# Altium footprint library SMotlaq-PCB_lib.PcbLib: 186 footprints (part 8 of 12)
Each footprint in its own frame and in the unit in brackets; x right, y up, seen from the top. Pads: shape width x height; smd on the part's side, far side on the other; paste and mask are expansions set on the pad; w line width, h text height; cw(c..) or ccw(c..) is an arc to the next point about the centre after c.
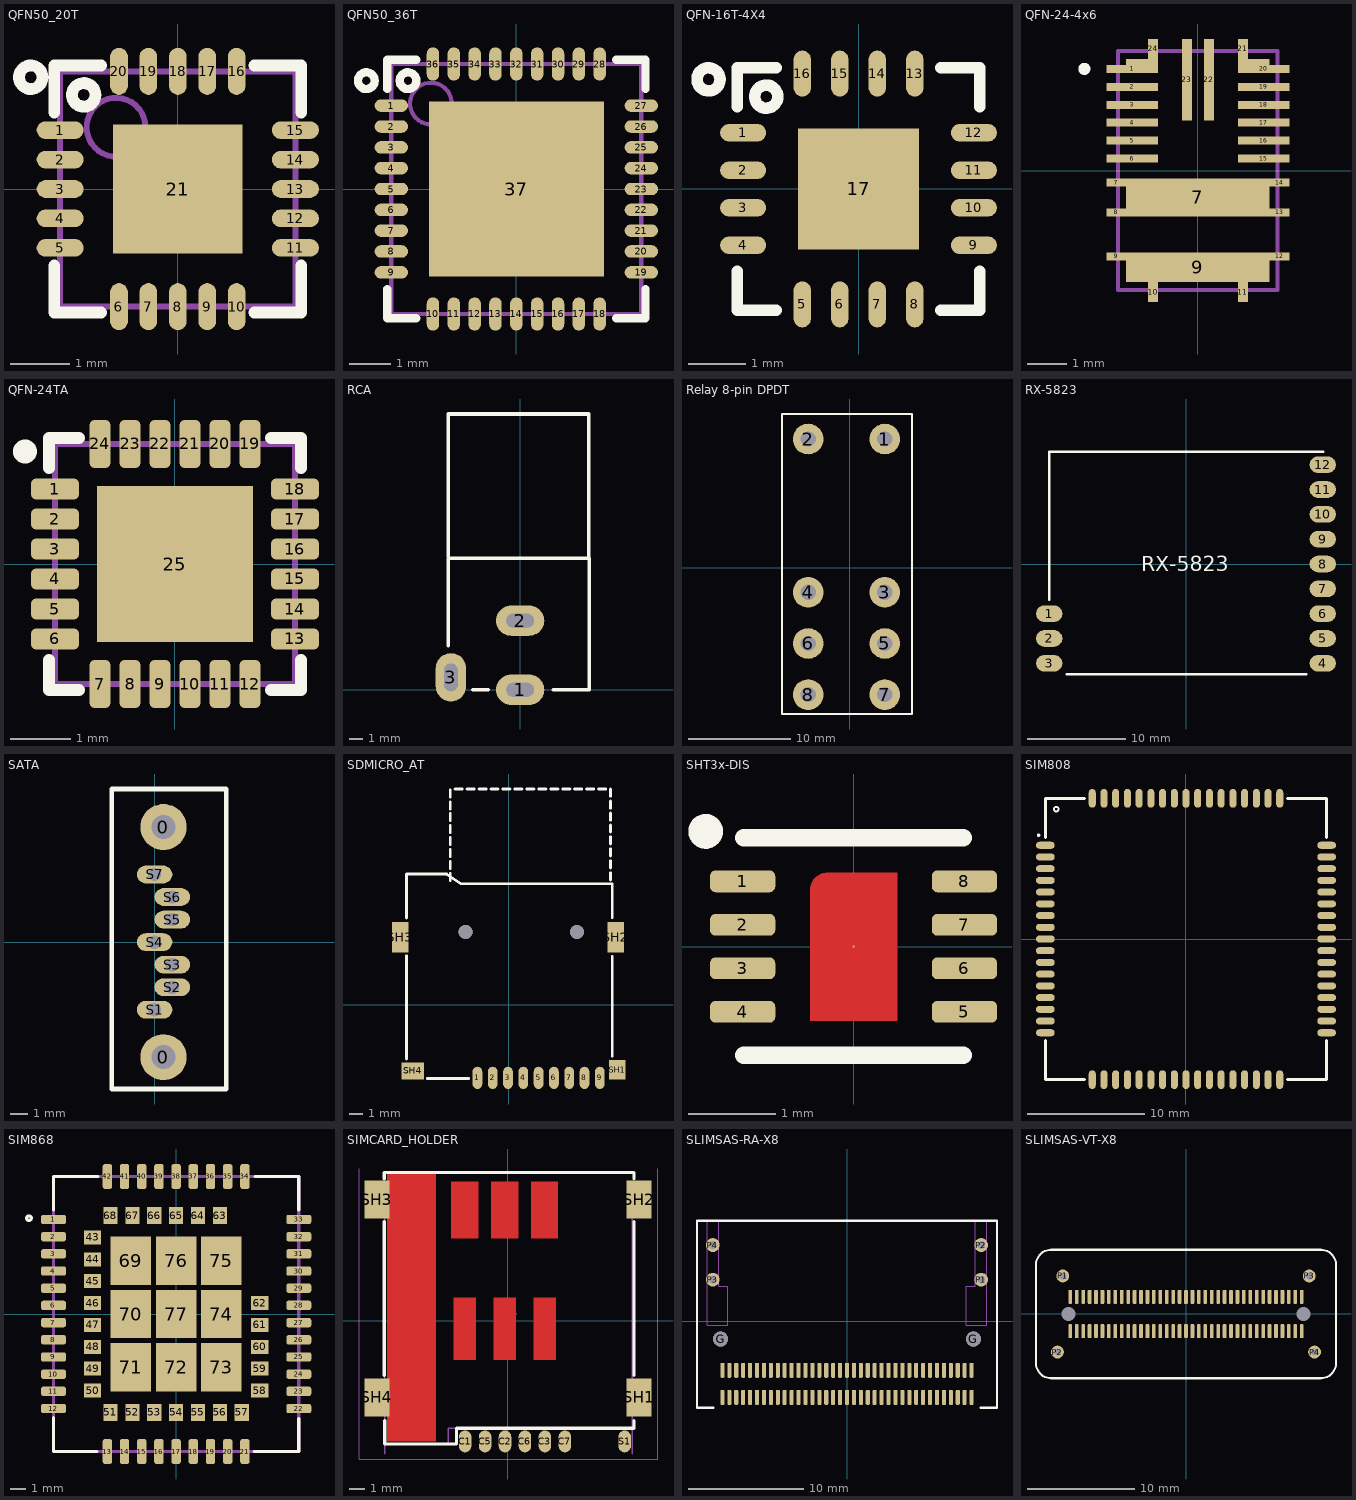
[diagram p7: the footprints below, top view; thin cyan lines are the x and y axes]

## QFN50_20T [mm] "QFN, 20, 4X4mm, 0.5mm"
height 1
pads (21):
  oval 0.8x0.3 smd mask+0.05: 1(-2,1) 2(-2,0.5) 3(-2,0) 4(-2,-0.5) 5(-2,-1) 11(2,-1) 12(2,-0.5) 13(2,0) 14(2,0.5) 15(2,1)
  oval 0.3x0.8 smd mask+0.05: 6(-1,-2) 7(-0.5,-2) 8(0,-2) 9(0.5,-2) 10(1,-2) 16(1,2) 17(0.5,2) 18(0,2) 19(-0.5,2) 20(-1,2)
  rect 2.2x2.2 smd paste-2 mask+0.1: 21(0,0)
Top Overlay:
  circle w0.2: c-2.5,1.9 r0.2
  circle w0.2: c-1.6,1.6 r0.2
  lines w0.2: -2.1,-1.3 -2.1,-2.1 -1.3,-2.1 ; -2.1,1.3 -2.1,2.1 -1.3,2.1 ; 1.3,-2.1 2.1,-2.1 2.1,-1.3 ; 1.3,2.1 2.1,2.1 2.1,1.3
Top Paste:
  rectangle: -1,0.2 -0.2,1
  region: 1,1 0.2,1 0.2,0.2 1,0.2
  region: 1,-0.2 0.2,-0.2 0.2,-1 1,-1
  rectangle: -1,-1 -0.2,-0.2
Mechanical 13:
  circle w0.1: c-1.05,1.05 r0.5
  lines w0.1: -2,-2 2,-2 2,2 -2,2 -2,-2
3D body: height 1, standoff 0, extent -2,-2 2,2

## QFN50_36T [mm] "MO-220-VJJD (JEDEC), 36 TQFN T3666+3 (MAXIM), 6X6mm, 0.5mm"
height 0.9
pads (37):
  oval 0.8x0.3 smd mask+0.05: 1(-3,2) 2(-3,1.5) 3(-3,1) 4(-3,0.5) 5(-3,0) 6(-3,-0.5) 7(-3,-1) 8(-3,-1.5) 9(-3,-2) 19(3,-2) 20(3,-1.5) 21(3,-1) 22(3,-0.5) 23(3,0) 24(3,0.5) 25(3,1) 26(3,1.5) 27(3,2)
  oval 0.3x0.8 smd mask+0.05: 10(-2,-3) 11(-1.5,-3) 12(-1,-3) 13(-0.5,-3) 14(0,-3) 15(0.5,-3) 16(1,-3) 17(1.5,-3) 18(2,-3) 28(2,3) 29(1.5,3) 30(1,3) 31(0.5,3) 32(0,3) 33(-0.5,3) 34(-1,3) 35(-1.5,3) 36(-2,3)
  rect 4.2x4.2 smd paste-3 mask+0.1: 37(0,0)
Top Overlay:
  circle w0.2: c-3.6,2.6 r0.2
  circle w0.2: c-2.6,2.6 r0.2
  lines w0.2: -3.1,-2.4 -3.1,-3.1 -2.4,-3.1 ; -3.1,2.4 -3.1,3.1 -2.4,3.1 ; 2.4,-3.1 3.1,-3.1 3.1,-2.4 ; 2.4,3.1 3.1,3.1 3.1,2.4
Top Paste:
  rectangle: -1,0.2 -0.2,1
  rectangle: -2,1.2 -1.2,2
  region: -0.2,2 -1,2 -1,1.2 -0.2,1.2
  rectangle: -2,0.2 -1.2,1
  region: 2,1 1.2,1 1.2,0.2 2,0.2
  rectangle: 0.2,1.2 1,2
  region: 2,2 1.2,2 1.2,1.2 2,1.2
  region: 1,1 0.2,1 0.2,0.2 1,0.2
  region: 1,-0.2 0.2,-0.2 0.2,-1 1,-1
  region: 2,-1.2 1.2,-1.2 1.2,-2 2,-2
  rectangle: 0.2,-2 1,-1.2
  region: 2,-0.2 1.2,-0.2 1.2,-1 2,-1
  rectangle: -2,-1 -1.2,-0.2
  region: -0.2,-1.2 -1,-1.2 -1,-2 -0.2,-2
  rectangle: -2,-2 -1.2,-1.2
  rectangle: -1,-1 -0.2,-0.2
Mechanical 13:
  circle w0.1: c-2.05,2.05 r0.5
  lines w0.1: -3,-3 -3,3 3,3 3,-3 -3,-3
3D body "ALSRobot-QFN36 6x6.step": height 0.9, standoff 0.01, extent -3.102,-3.103 3.103,3.103

## QFN-16T-4X4 [mm] "QFN, 16, 4X4mm, 0.5mm"
height 1
pads (17):
  oval 0.8x0.3 smd mask+0.075: 1(-2,0.975) 2(-2,0.325) 3(-2,-0.325) 4(-2,-0.975) 9(2,-0.975) 10(2,-0.325) 11(2,0.325) 12(2,0.975)
  oval 0.3x0.8 smd mask+0.075: 5(-0.975,-2) 6(-0.325,-2) 7(0.325,-2) 8(0.975,-2) 13(0.975,2) 14(0.325,2) 15(-0.325,2) 16(-0.975,2)
  rect 2.1x2.1 smd paste-3 mask+0.1: 17(0,0)
Top Overlay:
  circle w0.2: c-2.6,1.9 r0.2
  circle w0.2: c-1.6,1.6 r0.2
  lines w0.2: -2.1,-1.425 -2.1,-2.1 -1.425,-2.1 ; -2.1,1.425 -2.1,2.1 -1.425,2.1 ; 1.425,-2.1 2.1,-2.1 2.1,-1.425 ; 1.425,2.1 2.1,2.1 2.1,1.425
Top Paste:
  region: 1.05,1.05 0.15,1.05 0.15,0.15 1.05,0.15
  rectangle: -1.05,0.15 -0.15,1.05
  region: 1.05,-0.15 0.15,-0.15 0.15,-1.05 1.05,-1.05
  rectangle: -1.05,-1.05 -0.15,-0.15
3D body "User Library-SKY12209.step": height 1.5, standoff 0, extent -2,-2 2,2

## QFN-24-4x6 [mm]
pads (28):
  rect 1.3x0.2 smd: 1(-1.65,2.55) 2(-1.65,2.1) 3(-1.65,1.65) 4(-1.65,1.2) 5(-1.65,0.75) 6(-1.65,0.3) 15(1.65,0.3) 16(1.65,0.75) 17(1.65,1.2) 18(1.65,1.65) 19(1.65,2.1) 20(1.65,2.55)
  rect 0.8x0.15 smd: 1(-1.4,2.725) 20(1.4,2.725)
  rect 0.5x0.2 smd: 7(-2.05,-0.3) 8(-2.05,-1.05) 9(-2.05,-2.15) 12(2.05,-2.15) 13(2.05,-1.05) 14(2.05,-0.3)
  rect 3.6x0.95 smd: 7(0,-0.675)
  rect 3.6x0.75 smd: 9(0,-2.425)
  rect 0.25x0.5 smd: 10(-1.125,-3.05) 11(1.125,-3.05) 21(1.125,3.05) 24(-1.125,3.05)
  rect 0.25x2.05 smd: 22(0.275,2.275) 23(-0.275,2.275)
Top Overlay:
  lines w0.2: -2.9,2.55 ccw(c-2.85,2.55) -2.8,2.55 ; -2.9,2.55 cw(c-2.85,2.55) -2.8,2.55 ; -2.9,2.55 ccw(c-2.85,2.55) -2.8,2.55
Mechanical 15:
  lines w0.1: -2,-3 2,-3 2,3 -2,3 -2,-3
3D body "MPM3650CGQW-P.stp": height 1.75, standoff 0, extent -2,-3 2,3

## QFN-24TA [mm] "RTW, RGE S-PQFP-N24 (TI), HVQFN24, 4X4mm, 0.5mm"
height 1
pads (25):
  rrect50% 0.8x0.35 smd mask+0.05: 1(-2,1.25) 2(-2,0.75) 3(-2,0.25) 4(-2,-0.25) 5(-2,-0.75) 6(-2,-1.25) 13(2,-1.25) 14(2,-0.75) 15(2,-0.25) 16(2,0.25) 17(2,0.75) 18(2,1.25)
  rrect50% 0.35x0.8 smd mask+0.05: 7(-1.25,-2) 8(-0.75,-2) 9(-0.25,-2) 10(0.25,-2) 11(0.75,-2) 12(1.25,-2) 19(1.25,2) 20(0.75,2) 21(0.25,2) 22(-0.25,2) 23(-0.75,2) 24(-1.25,2)
  rect 2.6x2.6 smd paste-2 mask+0.05: 25(0,0)
Top Overlay:
  circle w0.2: c-2.5,1.875 r0.1
  lines w0.2: -2.1,-1.6 -2.1,-2.1 -1.6,-2.1 ; -2.1,1.6 -2.1,2.1 -1.6,2.1 ; 1.6,-2.1 2.1,-2.1 2.1,-1.6 ; 1.6,2.1 2.1,2.1 2.1,1.6
Top Paste:
  rectangle: -1.1,-1.1 -0.2,-0.2
  region: 1.1,-0.2 0.2,-0.2 0.2,-1.1 1.1,-1.1
  region: 1.1,1.1 0.2,1.1 0.2,0.2 1.1,0.2
  rectangle: -1.1,0.2 -0.2,1.1
Mechanical 13:
  lines w0.1: -2,-2 -2,2 2,2 2,-2 -2,-2
3D body "User Library-mpu-6050_qfn-24-1.step": height 0.88, standoff -0.02, extent -2.02,-2.02 2.02,2.02

## RCA [mm]
pads (3):
  oval 3.5x2.2 hole 1 slot 2 at 0 deg: 1(0,0) 2(0,5)
  oval 2.2x3.5 hole 1 slot 2 at 90 deg: 3(-5,0.9)
Top Overlay:
  lines w0.254: -5.207,3.175 -5.207,9.5 5,9.5 5,0 2.413,0 ; -5.207,9.652 -5.207,19.939 4.953,19.939 4.953,9.525 ; -3.429,0 -2.286,0
3D body "RCA.STEP": height 12, standoff -4, extent -5.174,0 4.826,20

## Relay 8-pin DPDT [mm]
pads (8):
  round 3 hole 1.5: 1(3.425,12.6) 2(-4.075,12.6) 3(3.425,-2.4) 4(-4.075,-2.4) 5(3.425,-7.4) 6(-4.075,-7.4) 7(3.425,-12.4) 8(-4.075,-12.4)
Top Overlay:
  lines w0.2: -6.625,-14.3 6.075,-14.3 6.075,15.05 -6.625,15.05 -6.625,-13.95 -6.625,-14.3
3D body "User Library-Relay 24VDC 8Pin.STEP": height 15.95, standoff -3.45, extent -6.625,-13.95 6.075,15.05

## RX-5823 [mm]
pads (12):
  oval 2.7x1.7 smd: 1(-14,-5.08) 2(-14,-7.62) 3(-14,-10.16) 4(14,-10.16) 5(14,-7.62) 6(14,-5.08) 7(14,-2.54) 8(14,0) 9(14,2.54) 10(14,5.08) 11(14,7.62) 12(14,10.16)
Top Overlay:
  lines w0.254: -14,-3.64 -14,11.473 14.067,11.473 ; -12.222,-11.26 12.289,-11.26
  text "RX-5823" at -4.602,-0.719 h1.52
3D body "RX-5823.STEP": height 2.8, standoff 0, extent -14,-11.26 14,11.24

## SATA [mm]
pads (9):
  round 2.6 hole 1.35 mask+0.05: 0(0.5,6.48) 0(0.5,-6.48)
  oval 2x1 hole 0.75 mask+0.05: S1(0,-3.81) S2(1,-2.54) S3(1,-1.27) S4(0,0) S5(1,1.27) S6(1,2.54) S7(0,3.81)
Top Overlay:
  lines w0.254: -2.425,-8.275 4.05,-8.275 4.05,8.625 -2.425,8.625 -2.425,-8.275
3D body "47155-4001.stp": height 2.2, standoff -8.85, extent -2.45,-8.285 4,8.615

## SDMICRO_AT [mm] "SDMICRO exist on Iran, Attend 112J-TDAR-R01 push-push"
height 1
pads (15):
  oval 0.7x1.6 smd: 1(-2.25,-5.25) 2(-1.15,-5.25) 3(-0.05,-5.25) 4(1.05,-5.25) 5(2.15,-5.25) 6(3.25,-5.25) 7(4.35,-5.25) 8(5.45,-5.25) 9(6.55,-5.25)
  rect 1.2x1.4 smd: SH1(7.8,-4.65)
  rect 1.2x2.2 smd: SH2(7.7,4.85) SH3(-7.8,4.85)
  rect 1.6x1.2 smd: SH4(-6.9,-4.75)
  round 1 hole 1 unplated: ""(-3.1,5.25) ""(4.9,5.25)
Top Overlay:
  lines w0.2: -7.35,-3.9 -7.35,3.53 ; -7.35,6.25 -7.35,9.4 -4.459,9.4 -3.449,8.7 7.45,8.7 7.45,6.26 ; -5.85,-5.3 -2.87,-5.3 ; -4.21,8.93 -4.21,9.45 ; -4.21,9.79 -4.21,10.31 ; -4.21,10.65 -4.21,11.17 ; -4.21,11.51 -4.21,12.03 ; -4.21,12.37 -4.21,12.89 ; -4.21,13.23 -4.21,13.75 ; -4.21,14.09 -4.21,14.61 ; -4.21,14.95 -4.21,15.47 ; -3.86,15.52 -3.34,15.52 ; -3,15.52 -2.48,15.52 ; -2.14,15.52 -1.62,15.52 ; -1.28,15.52 -0.76,15.52 ; -0.42,15.52 0.1,15.52 ; 0.44,15.52 0.96,15.52 ; 1.3,15.52 1.82,15.52 ; 2.16,15.52 2.68,15.52 ; 3.02,15.52 3.54,15.52 ; 3.88,15.52 4.4,15.52 ; 4.74,15.52 5.26,15.52 ; 5.6,15.52 6.12,15.52 ; 6.46,15.52 6.98,15.52 ; 7.32,8.98 7.32,9.5 ; 7.32,9.84 7.32,10.36 ; 7.32,10.7 7.32,11.22 ; 7.32,11.56 7.32,12.08 ; 7.32,12.42 7.32,12.94 ; 7.32,13.28 7.32,13.8 ; 7.32,14.14 7.32,14.66 ; 7.32,15 7.32,15.52 ; 7.45,-3.7 7.45,3.5
3D body "112J-TXAR-R_C_1.stp": height 1.85, standoff -0.6, extent -8.05,-5.702 8.05,9.3
3D body "User Library-Micro_SD.step": height 1.15, standoff 0.17, extent -4.026,-1.179 6.974,13.821

## SHT3x-DIS [mm]
pads (9):
  rrect50% 0.75x0.25 smd: 1(-1.275,0.75) 2(-1.275,0.25) 3(-1.275,-0.25) 4(-1.275,-0.75) 5(1.275,-0.75) 6(1.275,-0.25) 7(1.275,0.25) 8(1.275,0.75)
  round 0.025 smd: EP(0,0)
Top Layer:
  region: 0.5,-0.85 -0.5,-0.85 -0.5,0.65 -0.5,0.67 -0.492,0.708 -0.477,0.745 -0.455,0.777 -0.427,0.805 -0.395,0.827 -0.358,0.842 -0.32,0.85 -0.3,0.85 0.5,0.85
Top Overlay:
  circle w0.2: c-1.7,1.325 r0.1
  lines w0.2: -1.262,-1.25 1.263,-1.25 ; -1.262,1.25 1.263,1.25
3D body "User Library-SHT3x.STEP": height 0.9, standoff -0.01, extent -1.26,-1.25 1.26,1.25

## SIM808 [mm]
pads (68):
  rrect100% 1.6x0.6 smd: 1(-12,8) 2(-12,7) 3(-12,6) 4(-12,5) 5(-12,4) 6(-12,3) 7(-12,2) 8(-12,1) 9(-12,0) 10(-12,-1) 11(-12,-2) 12(-12,-3) 13(-12,-4) 14(-12,-5) 15(-12,-6) 16(-12,-7) 17(-12,-8) 35(12,-8) 36(12,-7) 37(12,-6) 38(12,-5) 39(12,-4) 40(12,-3) 41(12,-2) 42(12,-1) 43(12,0) 44(12,1) 45(12,2) 46(12,3) 47(12,4) 48(12,5) 49(12,6) 50(12,7) 51(12,8)
  rrect100% 0.6x1.6 smd: 18(-8,-12) 19(-7,-12) 20(-6,-12) 21(-5,-12) 22(-4,-12) 23(-3,-12) 24(-2,-12) 25(-1,-12) 26(0,-12) 27(1,-12) 28(2,-12) 29(3,-12) 30(4,-12) 31(5,-12) 32(6,-12) 33(7,-12) 34(8,-12) 52(8,12) 53(7,12) 54(6,12) 55(5,12) 56(4,12) 57(3,12) 58(2,12) 59(1,12) 60(0,12) 61(-1,12) 62(-2,12) 63(-3,12) 64(-4,12) 65(-5,12) 66(-6,12) 67(-7,12) 68(-8,12)
Top Overlay:
  circle w0.15: c-12.575,8.85 r0.075
  circle w0.15: c-11.075,11.075 r0.2
  lines w0.254: -12,-8.65 -12,-12 -8.65,-12 ; -12,8.65 -12,12 -8.65,12 ; 8.65,-12 12,-12 12,-8.65 ; 8.65,12 12,12 12,8.65
3D body "User Library-SIM808.step": height 2.9, standoff 0, extent -12,-12 12,12

## SIM868 [mm]
pads (77):
  rrect50% 1.6x0.6 smd: 1(-7.85,6.05) 2(-7.85,4.95) 3(-7.85,3.85) 4(-7.85,2.75) 5(-7.85,1.65) 6(-7.85,0.55) 7(-7.85,-0.55) 8(-7.85,-1.65) 9(-7.85,-2.75) 10(-7.85,-3.85) 11(-7.85,-4.95) 12(-7.85,-6.05) 22(7.85,-6.05) 23(7.85,-4.95) 24(7.85,-3.85) 25(7.85,-2.75) 26(7.85,-1.65) 27(7.85,-0.55) 28(7.85,0.55) 29(7.85,1.65) 30(7.85,2.75) 31(7.85,3.85) 32(7.85,4.95) 33(7.85,6.05)
  rrect50% 0.6x1.6 smd: 13(-4.4,-8.8) 14(-3.3,-8.8) 15(-2.2,-8.8) 16(-1.1,-8.8) 17(0,-8.8) 18(1.1,-8.8) 19(2.2,-8.8) 20(3.3,-8.8) 21(4.4,-8.8) 34(4.4,8.8) 35(3.3,8.8) 36(2.2,8.8) 37(1.1,8.8) 38(0,8.8) 39(-1.1,8.8) 40(-2.2,8.8) 41(-3.3,8.8) 42(-4.4,8.8)
  rect 1.1x0.9 smd: 43(-5.35,4.9) 44(-5.35,3.5) 45(-5.35,2.1) 46(-5.35,0.7) 47(-5.35,-0.7) 48(-5.35,-2.1) 49(-5.35,-3.5) 50(-5.35,-4.9) 58(5.35,-4.9) 59(5.35,-3.5) 60(5.35,-2.1) 61(5.35,-0.7) 62(5.35,0.7)
  rect 0.9x1.1 smd: 51(-4.2,-6.3) 52(-2.8,-6.3) 53(-1.4,-6.3) 54(0,-6.3) 55(1.4,-6.3) 56(2.8,-6.3) 57(4.2,-6.3) 63(2.8,6.3) 64(1.4,6.3) 65(0,6.3) 66(-1.4,6.3) 67(-2.8,6.3) 68(-4.2,6.3)
  rect 2.6x3.1 smd: 69(-2.9,3.4) 70(-2.9,0) 71(-2.9,-3.4) 72(0,-3.4) 73(2.9,-3.4) 74(2.9,0) 75(2.9,3.4) 76(0,3.4) 77(0,0)
Top Overlay:
  circle w0.2: c-9.417,6.132 r0.144
  lines w0.2: -7.85,-6.625 -7.85,-8.8 -5.075,-8.8 ; -7.85,6.675 -7.85,8.8 -5,8.8 ; 5,-8.8 7.85,-8.8 7.85,-6.7 ; 5.05,8.8 7.85,8.8 7.85,6.65
Mechanical 13:
  lines w0.2: -7.85,-8.8 7.85,-8.8 7.85,8.8 -7.85,8.8 -7.85,-8.8
3D body "User Library-SIM868-1.step": height 2.5, standoff 0, extent -7.85,-8.8 7.85,8.8

## SIMCARD_HOLDER [mm]
height 1.5
pads (11):
  oval 0.8x1.4 smd: C1(-2.73,-7.7) C2(-0.19,-7.7) C3(2.35,-7.7) C5(-1.46,-7.7) C6(1.08,-7.7) C7(3.62,-7.7) S1(7.43,-7.7)
  rect 1.6x2.4 smd: SH1(8.35,-4.9) SH2(8.35,7.7) SH3(-8.35,7.7) SH4(-8.35,-4.9)
Top Layer:
  pour cut-out: -4.59,9.305 -7.68,9.305 -7.68,-7.695 -4.59,-7.695
  pour cut-out: -3.6,8.825 -3.6,5.245 -1.9,5.245 -1.9,8.825
  pour cut-out: -1.06,8.825 -1.06,5.245 0.64,5.245 0.64,8.825
  pour cut-out: 1.48,8.825 1.48,5.245 3.18,5.245 3.18,8.825
  pour cut-out: -3.45,1.445 -2.05,1.445 -2.05,-2.495 -3.45,-2.495
  pour cut-out: -0.91,1.445 0.49,1.445 0.49,-2.495 -0.91,-2.495
  pour cut-out: 1.63,1.445 3.03,1.445 3.03,-2.495 1.63,-2.495
Top Overlay:
  lines w0.2: -7.875,-3.485 -7.875,6.315 ; -7.875,9.015 -7.875,9.415 8.025,9.415 8.025,9.015 ; -7.85,-6.385 -7.85,-7.865 -3.275,-7.865 -3.275,-6.855 8.025,-6.855 8.025,-6.385 ; 8.025,-3.485 8.025,6.315
Mechanical 13:
  lines w0.1: -7.85,-8.475 -7.85,7.685 ; -7.85,-7.865 -3.815,-7.865 -3.815,-6.855 7.9,-6.855 ; 7.9,-8.475 7.9,8.695
Mechanical 15:
  lines w0.05: -9.475,9.665 -9.475,-8.835 ; 9.525,9.665 9.525,-8.835 ; -9.475,-8.835 9.525,-8.835 ; -9.475,-8.835 9.525,-8.835
  lines w0.1: -0.475,0.415 0.525,0.415 ; 0.025,-0.085 0.025,0.915
3D body "sim7100-8-1-15-00-a_reva.step": height 1.47, standoff -0.03, extent -8.35,-8.025 8.4,9.305

## SLIMSAS-RA-X8 [mm]
height 6.7
pads (80):
  rrect50% 0.35x1.3 smd mask+0.075: A1(10.8,-4.25) A2(10.2,-4.25) A3(9.6,-4.25) A4(9,-4.25) A5(8.4,-4.25) A6(7.8,-4.25) A7(7.2,-4.25) A8(6.6,-4.25) A9(6,-4.25) A10(5.4,-4.25) A11(4.8,-4.25) A12(4.2,-4.25) A13(3.6,-4.25) A14(3,-4.25) A15(2.4,-4.25) A16(1.8,-4.25) A17(1.2,-4.25) A18(0.6,-4.25) A19(0,-4.25) A20(-0.6,-4.25) A21(-1.2,-4.25) A22(-1.8,-4.25) A23(-2.4,-4.25) A24(-3,-4.25) A25(-3.6,-4.25) A26(-4.2,-4.25) A27(-4.8,-4.25) A28(-5.4,-4.25) A29(-6,-4.25) A30(-6.6,-4.25) A31(-7.2,-4.25) A32(-7.8,-4.25) A33(-8.4,-4.25) A34(-9,-4.25) A35(-9.6,-4.25) A36(-10.2,-4.25) A37(-10.8,-4.25) B1(10.8,-6.6) B2(10.2,-6.6) B3(9.6,-6.6) B4(9,-6.6) B5(8.4,-6.6) B6(7.8,-6.6) B7(7.2,-6.6) B8(6.6,-6.6) B9(6,-6.6) B10(5.4,-6.6) B11(4.8,-6.6) B12(4.2,-6.6) B13(3.6,-6.6) B14(3,-6.6) B15(2.4,-6.6) B16(1.8,-6.6) B17(1.2,-6.6) B18(0.6,-6.6) B19(0,-6.6) B20(-0.6,-6.6) B21(-1.2,-6.6) B22(-1.8,-6.6) B23(-2.4,-6.6) B24(-3,-6.6) B25(-3.6,-6.6) B26(-4.2,-6.6) B27(-4.8,-6.6) B28(-5.4,-6.6) B29(-6,-6.6) B30(-6.6,-6.6) B31(-7.2,-6.6) B32(-7.8,-6.6) B33(-8.4,-6.6) B34(-9,-6.6) B35(-9.6,-6.6) B36(-10.2,-6.6) B37(-10.8,-6.6)
  round 1.3 hole 1.3 unplated mask+0.1: G(-10.95,-1.55) G(10.95,-1.55)
  round 1.2 hole 0.66 mask+0.075: P1(11.63,3.6) P2(11.63,6.6) P3(-11.63,3.6) P4(-11.63,6.6)
Top Overlay:
  lines w0.2: -11.575,-7.5 -13,-7.5 -13,8.7 13,8.7 13,-7.5 11.575,-7.5
Mechanical 13:
  lines w0.1: -12.13,-0.35 -10.35,-0.35 -10.35,3.05 -11.13,3.05 -11.13,8.75 -12.13,8.75 -12.13,-0.35 ; 10.35,-0.35 10.35,3.05 11.13,3.05 11.13,8.75 12.13,8.75 12.13,-0.35 10.35,-0.35
3D body "u10-a474-24xt.x_t": height 6.59, standoff -2.21, extent -11.75,-7 11.75,8.8

## SLIMSAS-VT-X8 [mm]
pads (80):
  rrect50% 0.35x1.3 smd mask+0.075: A1(-10.8,-1.6) A2(-10.2,-1.6) A3(-9.6,-1.6) A4(-9,-1.6) A5(-8.4,-1.6) A6(-7.8,-1.6) A7(-7.2,-1.6) A8(-6.6,-1.6) A9(-6,-1.6) A10(-5.4,-1.6) A11(-4.8,-1.6) A12(-4.2,-1.6) A13(-3.6,-1.6) A14(-3,-1.6) A15(-2.4,-1.6) A16(-1.8,-1.6) A17(-1.2,-1.6) A18(-0.6,-1.6) A19(0,-1.6) A20(0.6,-1.6) A21(1.2,-1.6) A22(1.8,-1.6) A23(2.4,-1.6) A24(3,-1.6) A25(3.6,-1.6) A26(4.2,-1.6) A27(4.8,-1.6) A28(5.4,-1.6) A29(6,-1.6) A30(6.6,-1.6) A31(7.2,-1.6) A32(7.8,-1.6) A33(8.4,-1.6) A34(9,-1.6) A35(9.6,-1.6) A36(10.2,-1.6) A37(10.8,-1.6) B1(-10.8,1.6) B2(-10.2,1.6) B3(-9.6,1.6) B4(-9,1.6) B5(-8.4,1.6) B6(-7.8,1.6) B7(-7.2,1.6) B8(-6.6,1.6) B9(-6,1.6) B10(-5.4,1.6) B11(-4.8,1.6) B12(-4.2,1.6) B13(-3.6,1.6) B14(-3,1.6) B15(-2.4,1.6) B16(-1.8,1.6) B17(-1.2,1.6) B18(-0.6,1.6) B19(0,1.6) B20(0.6,1.6) B21(1.2,1.6) B22(1.8,1.6) B23(2.4,1.6) B24(3,1.6) B25(3.6,1.6) B26(4.2,1.6) B27(4.8,1.6) B28(5.4,1.6) B29(6,1.6) B30(6.6,1.6) B31(7.2,1.6) B32(7.8,1.6) B33(8.4,1.6) B34(9,1.6) B35(9.6,1.6) B36(10.2,1.6) B37(10.8,1.6)
  rrect50% 0x0 hole 1.3 unplated mask+0.075: A75(-10.95,0) A75(10.95,0)
  round 1.2 hole 0.66 mask+0.075: P1(-11.5,3.55) P2(-12,-3.55) P3(11.5,3.55) P4(12,-3.55)
Top Overlay:
  lines w0.2: -14,-4.592 ccw(c-12.592,-4.592) -12.592,-6 12.592,-6 ccw(c12.592,-4.592) 14,-4.592 14,4.592 ccw(c12.592,4.592) 12.592,6 -12.592,6 ccw(c-12.592,4.592) -14,4.592 -14,3.05 -14,-4.592
3D body "U10BH7426101T--3DModel-STEP-533182.STEP": height 14.3, standoff -4.2, extent -12.25,-4.35 12.25,4.35